# Altium schematic symbol library jlcpcb_2025_04_capacitors_extended_0201.schlib: 1175 symbols (part 3 of 7)
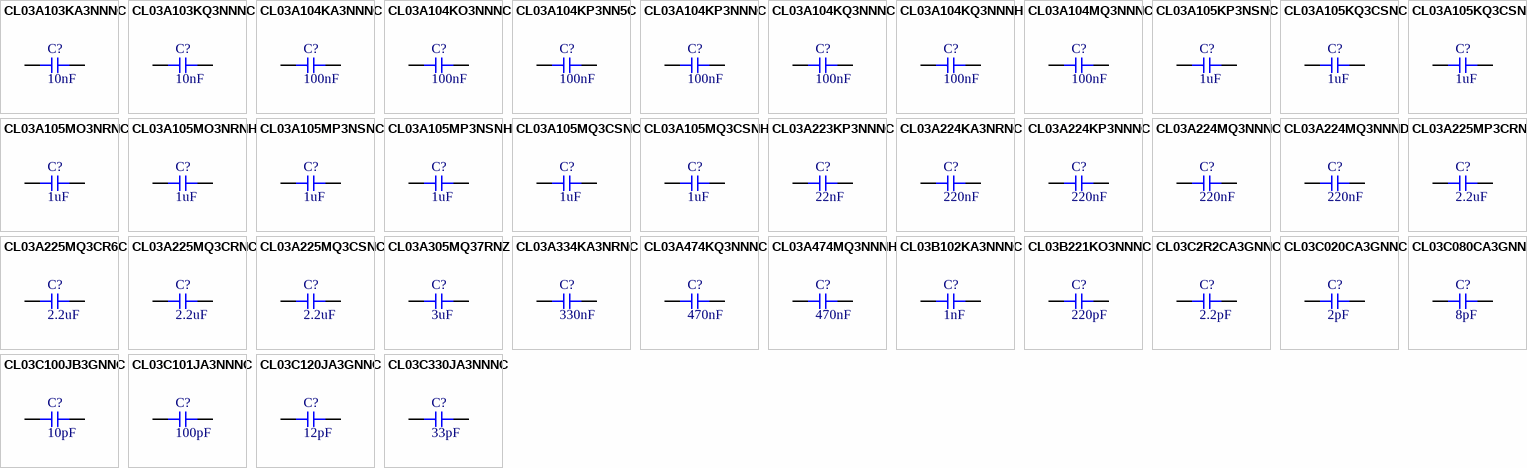
[diagram p31: symbols CL03A103KA3NNNC to CL03C330JA3NNNC]

## CL03A105KQ3CSNH
designator C?  Capacitance: 1uF  (hidden comment: *)
Capacitor, Ceramic (MLCC), 1uF, ±10%, 6.3V, X5R, ±10%, SMD 0201; Manufacturer: Samsung Electro-Mechanics; Manufacturer Part Number: CL03A105KQ3CSNH; Package Size: 0201; JLCPCB Basic Part: No; JLCPCB Part Number: C318542; Supplier 1: LCSC; Category: Capacitors - MLCC; Supplier Part Number 1: C318542; Tolerance: ±10%; Voltage Rating: 6.3V; Temperature Coefficient: X5R; RoHS: Yes; ComponentLink1Description: Datasheet; ComponentLink1URL: https://wmsc.lcsc.com/wmsc/upload/file/pdf/v2/lcsc/2304140030_Samsung-Electro-Mechanics-CL03A105KQ3CSNH_C318542.pdf; ComponentLink2Description: JLCPCB Part URL; ComponentLink2URL: https://jlcpcb.com/partdetail/C318542; ComponentLink3Description: LCSC Part URL; ComponentLink3URL: https://lcsc.com/product-detail/Multilayer-Ceramic-Capacitors-MLCC---SMD-SMT_Samsung-Electro-Mechanics-Samsung-Electro-Mechanics-CL03A105KQ3CSNH_C318542.html; ComponentLink4Description: Samsung Component Library; ComponentLink4URL: https://weblib.samsungsem.com/mlcc/mlcc-ec.do?partNumber=CL03A105KQ3CSN
footprint CAP-0201 (0201 (0603M) Capacitor)
pins: 1, 2

## CL03A105MO3NRNC
designator C?  Capacitance: 1uF  (hidden comment: *)
Capacitor, Ceramic (MLCC), 1uF, ±20%, 16V, X5R, ±20%, SMD 0201; Manufacturer: Samsung Electro-Mechanics; Manufacturer Part Number: CL03A105MO3NRNC; Package Size: 0201; JLCPCB Basic Part: No; JLCPCB Part Number: C318540; Supplier 1: LCSC; Category: Capacitors - MLCC; Supplier Part Number 1: C318540; Tolerance: ±20%; Voltage Rating: 16V; Temperature Coefficient: X5R; RoHS: Yes; ComponentLink1Description: Datasheet; ComponentLink1URL: https://wmsc.lcsc.com/wmsc/upload/file/pdf/v2/lcsc/2401181241_Samsung-Electro-Mechanics-CL03A105MO3NRNC_C318540.pdf; ComponentLink2Description: JLCPCB Part URL; ComponentLink2URL: https://jlcpcb.com/partdetail/C318540; ComponentLink3Description: LCSC Part URL; ComponentLink3URL: https://lcsc.com/product-detail/Multilayer-Ceramic-Capacitors-MLCC---SMD-SMT_Samsung-Electro-Mechanics-Samsung-Electro-Mechanics-CL03A105MO3NRNC_C318540.html; ComponentLink4Description: Samsung Component Library; ComponentLink4URL: https://weblib.samsungsem.com/mlcc/mlcc-ec.do?partNumber=CL03A105MO3NRN
footprint CAP-0201 (0201 (0603M) Capacitor)
pins: 1, 2

## CL03A105MO3NRNH
designator C?  Capacitance: 1uF  (hidden comment: *)
Capacitor, Ceramic (MLCC), 1uF, ±20%, 16V, X5R, ±20%, SMD 0201; Manufacturer: Samsung Electro-Mechanics; Manufacturer Part Number: CL03A105MO3NRNH; Package Size: 0201; JLCPCB Basic Part: No; JLCPCB Part Number: C307385; Supplier 1: LCSC; Category: Capacitors - MLCC; Supplier Part Number 1: C307385; Tolerance: ±20%; Voltage Rating: 16V; Temperature Coefficient: X5R; RoHS: Yes; ComponentLink1Description: Datasheet; ComponentLink1URL: https://wmsc.lcsc.com/wmsc/upload/file/pdf/v2/lcsc/2304140030_Samsung-Electro-Mechanics-CL03A105MO3NRNH_C307385.pdf; ComponentLink2Description: JLCPCB Part URL; ComponentLink2URL: https://jlcpcb.com/partdetail/C307385; ComponentLink3Description: LCSC Part URL; ComponentLink3URL: https://lcsc.com/product-detail/Multilayer-Ceramic-Capacitors-MLCC---SMD-SMT_Samsung-Electro-Mechanics-Samsung-Electro-Mechanics-CL03A105MO3NRNH_C307385.html; ComponentLink4Description: Samsung Component Library; ComponentLink4URL: https://weblib.samsungsem.com/mlcc/mlcc-ec.do?partNumber=CL03A105MO3NRN
footprint CAP-0201 (0201 (0603M) Capacitor)
pins: 1, 2

## CL03A105MP3NSNC
designator C?  Capacitance: 1uF  (hidden comment: *)
Capacitor, Ceramic (MLCC), 1uF, ±20%, 10V, X5R, ±20%, SMD 0201; Manufacturer: Samsung Electro-Mechanics; Manufacturer Part Number: CL03A105MP3NSNC; Package Size: 0201; JLCPCB Basic Part: No; JLCPCB Part Number: C170153; Supplier 1: LCSC; Category: Capacitors - MLCC; Supplier Part Number 1: C170153; Tolerance: ±20%; Voltage Rating: 10V; Temperature Coefficient: X5R; RoHS: Yes; ComponentLink1Description: Datasheet; ComponentLink1URL: https://wmsc.lcsc.com/wmsc/upload/file/pdf/v2/lcsc/2304140030_Samsung-Electro-Mechanics-CL03A105MP3NSNC_C170153.pdf; ComponentLink2Description: JLCPCB Part URL; ComponentLink2URL: https://jlcpcb.com/partdetail/C170153; ComponentLink3Description: LCSC Part URL; ComponentLink3URL: https://lcsc.com/product-detail/Multilayer-Ceramic-Capacitors-MLCC---SMD-SMT_Samsung-Electro-Mechanics-Samsung-Electro-Mechanics-CL03A105MP3NSNC_C170153.html; ComponentLink4Description: Samsung Component Library; ComponentLink4URL: https://weblib.samsungsem.com/mlcc/mlcc-ec.do?partNumber=CL03A105MP3NSN
footprint CAP-0201 (0201 (0603M) Capacitor)
pins: 1, 2

## CL03A105MP3NSNH
designator C?  Capacitance: 1uF  (hidden comment: *)
Capacitor, Ceramic (MLCC), 1uF, 10V, X5R, SMD 0201; Manufacturer: Samsung Electro-Mechanics; Manufacturer Part Number: CL03A105MP3NSNH; Package Size: 0201; JLCPCB Basic Part: No; JLCPCB Part Number: C2991185; Supplier 1: LCSC; Category: Capacitors - MLCC; Supplier Part Number 1: C2991185; Voltage Rating: 10V; Temperature Coefficient: X5R; RoHS: Yes; ComponentLink1Description: Datasheet; ComponentLink1URL: https://wmsc.lcsc.com/wmsc/upload/file/pdf/v2/lcsc/2204121500_Samsung-Electro-Mechanics-CL03A105MP3NSNH_C2991185.pdf; ComponentLink2Description: JLCPCB Part URL; ComponentLink2URL: https://jlcpcb.com/partdetail/C2991185; ComponentLink3Description: LCSC Part URL; ComponentLink3URL: https://lcsc.com/product-detail/Multilayer-Ceramic-Capacitors-MLCC---SMD-SMT_Samsung-Electro-Mechanics-Samsung-Electro-Mechanics-CL03A105MP3NSNH_C2991185.html; ComponentLink4Description: Samsung Component Library; ComponentLink4URL: https://weblib.samsungsem.com/mlcc/mlcc-ec.do?partNumber=CL03A105MP3NSN
footprint CAP-0201 (0201 (0603M) Capacitor)
pins: 1, 2

## CL03A105MQ3CSNC
designator C?  Capacitance: 1uF  (hidden comment: *)
Capacitor, Ceramic (MLCC), 1uF, ±20%, 6.3V, X5R, ±20%, SMD 0201; Manufacturer: Samsung Electro-Mechanics; Manufacturer Part Number: CL03A105MQ3CSNC; Package Size: 0201; JLCPCB Basic Part: No; JLCPCB Part Number: C170152; Supplier 1: LCSC; Category: Capacitors - MLCC; Supplier Part Number 1: C170152; Tolerance: ±20%; Voltage Rating: 6.3V; Temperature Coefficient: X5R; RoHS: Yes; ComponentLink1Description: Datasheet; ComponentLink1URL: https://wmsc.lcsc.com/wmsc/upload/file/pdf/v2/lcsc/2304140030_Samsung-Electro-Mechanics-CL03A105MQ3CSNC_C170152.pdf; ComponentLink2Description: JLCPCB Part URL; ComponentLink2URL: https://jlcpcb.com/partdetail/C170152; ComponentLink3Description: LCSC Part URL; ComponentLink3URL: https://lcsc.com/product-detail/Multilayer-Ceramic-Capacitors-MLCC---SMD-SMT_Samsung-Electro-Mechanics-Samsung-Electro-Mechanics-CL03A105MQ3CSNC_C170152.html; ComponentLink4Description: Samsung Component Library; ComponentLink4URL: https://weblib.samsungsem.com/mlcc/mlcc-ec.do?partNumber=CL03A105MQ3CSN
footprint CAP-0201 (0201 (0603M) Capacitor)
pins: 1, 2

## CL03A105MQ3CSNH
designator C?  Capacitance: 1uF  (hidden comment: *)
Capacitor, Ceramic (MLCC), 1uF, ±20%, 6.3V, X5R, ±20%, SMD 0201; Manufacturer: Samsung Electro-Mechanics; Manufacturer Part Number: CL03A105MQ3CSNH; Package Size: 0201; JLCPCB Basic Part: No; JLCPCB Part Number: C53067; Supplier 1: LCSC; Category: Capacitors - MLCC; Supplier Part Number 1: C53067; Tolerance: ±20%; Voltage Rating: 6.3V; Temperature Coefficient: X5R; RoHS: Yes; ComponentLink1Description: Datasheet; ComponentLink1URL: https://wmsc.lcsc.com/wmsc/upload/file/pdf/v2/lcsc/2304140030_Samsung-Electro-Mechanics-CL03A105MQ3CSNH_C53067.pdf; ComponentLink2Description: JLCPCB Part URL; ComponentLink2URL: https://jlcpcb.com/partdetail/C53067; ComponentLink3Description: LCSC Part URL; ComponentLink3URL: https://lcsc.com/product-detail/Multilayer-Ceramic-Capacitors-MLCC---SMD-SMT_Samsung-Electro-Mechanics-Samsung-Electro-Mechanics-CL03A105MQ3CSNH_C53067.html; ComponentLink4Description: Samsung Component Library; ComponentLink4URL: https://weblib.samsungsem.com/mlcc/mlcc-ec.do?partNumber=CL03A105MQ3CSN
footprint CAP-0201 (0201 (0603M) Capacitor)
pins: 1, 2

## CL03A223KP3NNNC
designator C?  Capacitance: 22nF  (hidden comment: *)
Capacitor, Ceramic (MLCC), 22nF, ±10%, 10V, X5R, ±10%, SMD 0201; Manufacturer: Samsung Electro-Mechanics; Manufacturer Part Number: CL03A223KP3NNNC; Package Size: 0201; JLCPCB Basic Part: No; JLCPCB Part Number: C318550; Supplier 1: LCSC; Category: Capacitors - MLCC; Supplier Part Number 1: C318550; Tolerance: ±10%; Voltage Rating: 10V; Temperature Coefficient: X5R; RoHS: Yes; ComponentLink1Description: Datasheet; ComponentLink1URL: https://wmsc.lcsc.com/wmsc/upload/file/pdf/v2/lcsc/2304140030_Samsung-Electro-Mechanics-CL03A223KP3NNNC_C318550.pdf; ComponentLink2Description: JLCPCB Part URL; ComponentLink2URL: https://jlcpcb.com/partdetail/C318550; ComponentLink3Description: LCSC Part URL; ComponentLink3URL: https://lcsc.com/product-detail/Multilayer-Ceramic-Capacitors-MLCC---SMD-SMT_Samsung-Electro-Mechanics-Samsung-Electro-Mechanics-CL03A223KP3NNNC_C318550.html; ComponentLink4Description: Samsung Component Library; ComponentLink4URL: https://weblib.samsungsem.com/mlcc/mlcc-ec.do?partNumber=CL03A223KP3NNN
footprint CAP-0201 (0201 (0603M) Capacitor)
pins: 1, 2

## CL03A224KA3NRNC
designator C?  Capacitance: 220nF  (hidden comment: *)
Capacitor, Ceramic (MLCC), 220nF, ±10%, 25V, X5R, ±10%, SMD 0201; Manufacturer: Samsung Electro-Mechanics; Manufacturer Part Number: CL03A224KA3NRNC; Package Size: 0201; JLCPCB Basic Part: No; JLCPCB Part Number: C2839438; Supplier 1: LCSC; Category: Capacitors - MLCC; Supplier Part Number 1: C2839438; Tolerance: ±10%; Voltage Rating: 25V; Temperature Coefficient: X5R; RoHS: Yes; ComponentLink1Description: Datasheet; ComponentLink1URL: https://wmsc.lcsc.com/wmsc/upload/file/pdf/v2/lcsc/2202132000_Samsung-Electro-Mechanics-CL03A224KA3NRNC_C2839438.pdf; ComponentLink2Description: JLCPCB Part URL; ComponentLink2URL: https://jlcpcb.com/partdetail/C2839438; ComponentLink3Description: LCSC Part URL; ComponentLink3URL: https://lcsc.com/product-detail/Multilayer-Ceramic-Capacitors-MLCC---SMD-SMT_Samsung-Electro-Mechanics-Samsung-Electro-Mechanics-CL03A224KA3NRNC_C2839438.html; ComponentLink4Description: Samsung Component Library; ComponentLink4URL: https://weblib.samsungsem.com/mlcc/mlcc-ec.do?partNumber=CL03A224KA3NRN
footprint CAP-0201 (0201 (0603M) Capacitor)
pins: 1, 2

## CL03A224KP3NNNC
designator C?  Capacitance: 220nF  (hidden comment: *)
Capacitor, Ceramic (MLCC), 220nF, ±10%, 10V, X5R, ±10%, SMD 0201; Manufacturer: Samsung Electro-Mechanics; Manufacturer Part Number: CL03A224KP3NNNC; Package Size: 0201; JLCPCB Basic Part: No; JLCPCB Part Number: C307386; Supplier 1: LCSC; Category: Capacitors - MLCC; Supplier Part Number 1: C307386; Tolerance: ±10%; Voltage Rating: 10V; Temperature Coefficient: X5R; RoHS: Yes; ComponentLink1Description: Datasheet; ComponentLink1URL: https://wmsc.lcsc.com/wmsc/upload/file/pdf/v2/lcsc/2309061404_Samsung-Electro-Mechanics-CL03A224KP3NNNC_C307386.pdf; ComponentLink2Description: JLCPCB Part URL; ComponentLink2URL: https://jlcpcb.com/partdetail/C307386; ComponentLink3Description: LCSC Part URL; ComponentLink3URL: https://lcsc.com/product-detail/Multilayer-Ceramic-Capacitors-MLCC---SMD-SMT_Samsung-Electro-Mechanics-Samsung-Electro-Mechanics-CL03A224KP3NNNC_C307386.html; ComponentLink4Description: Samsung Component Library; ComponentLink4URL: https://weblib.samsungsem.com/mlcc/mlcc-ec.do?partNumber=CL03A224KP3NNN
footprint CAP-0201 (0201 (0603M) Capacitor)
pins: 1, 2

## CL03A224MQ3NNNC
designator C?  Capacitance: 220nF  (hidden comment: *)
Capacitor, Ceramic (MLCC), 220nF, ±20%, 6.3V, X5R, ±20%, SMD 0201; Manufacturer: Samsung Electro-Mechanics; Manufacturer Part Number: CL03A224MQ3NNNC; Package Size: 0201; JLCPCB Basic Part: No; JLCPCB Part Number: C34696; Supplier 1: LCSC; Category: Capacitors - MLCC; Supplier Part Number 1: C34696; Tolerance: ±20%; Voltage Rating: 6.3V; Temperature Coefficient: X5R; RoHS: Yes; ComponentLink1Description: Datasheet; ComponentLink1URL: https://wmsc.lcsc.com/wmsc/upload/file/pdf/v2/lcsc/2304140030_Samsung-Electro-Mechanics-CL03A224MQ3NNNC_C34696.pdf; ComponentLink2Description: JLCPCB Part URL; ComponentLink2URL: https://jlcpcb.com/partdetail/C34696; ComponentLink3Description: LCSC Part URL; ComponentLink3URL: https://lcsc.com/product-detail/Multilayer-Ceramic-Capacitors-MLCC---SMD-SMT_Samsung-Electro-Mechanics-Samsung-Electro-Mechanics-CL03A224MQ3NNNC_C34696.html; ComponentLink4Description: Samsung Component Library; ComponentLink4URL: https://weblib.samsungsem.com/mlcc/mlcc-ec.do?partNumber=CL03A224MQ3NNN
footprint CAP-0201 (0201 (0603M) Capacitor)
pins: 1, 2

## CL03A224MQ3NNND
designator C?  Capacitance: 220nF  (hidden comment: *)
Capacitor, Ceramic (MLCC), 220nF, ±20%, 6.3V, X5R, ±20%, SMD 0201; Manufacturer: Samsung Electro-Mechanics; Manufacturer Part Number: CL03A224MQ3NNND; Package Size: 0201; JLCPCB Basic Part: No; JLCPCB Part Number: C307387; Supplier 1: LCSC; Category: Capacitors - MLCC; Supplier Part Number 1: C307387; Tolerance: ±20%; Voltage Rating: 6.3V; Temperature Coefficient: X5R; RoHS: Yes; ComponentLink1Description: Datasheet; ComponentLink1URL: https://wmsc.lcsc.com/wmsc/upload/file/pdf/v2/lcsc/2304140030_Samsung-Electro-Mechanics-CL03A224MQ3NNND_C307387.pdf; ComponentLink2Description: JLCPCB Part URL; ComponentLink2URL: https://jlcpcb.com/partdetail/C307387; ComponentLink3Description: LCSC Part URL; ComponentLink3URL: https://lcsc.com/product-detail/Multilayer-Ceramic-Capacitors-MLCC---SMD-SMT_Samsung-Electro-Mechanics-Samsung-Electro-Mechanics-CL03A224MQ3NNND_C307387.html; ComponentLink4Description: Samsung Component Library; ComponentLink4URL: https://weblib.samsungsem.com/mlcc/mlcc-ec.do?partNumber=CL03A224MQ3NNN
footprint CAP-0201 (0201 (0603M) Capacitor)
pins: 1, 2

## CL03A225MP3CRNC
designator C?  Capacitance: 2.2uF  (hidden comment: *)
Capacitor, Ceramic (MLCC), 2.2uF, ±20%, 10V, X5R, ±20%, SMD 0201; Manufacturer: Samsung Electro-Mechanics; Manufacturer Part Number: CL03A225MP3CRNC; Package Size: 0201; JLCPCB Basic Part: No; JLCPCB Part Number: C318539; Supplier 1: LCSC; Category: Capacitors - MLCC; Supplier Part Number 1: C318539; Tolerance: ±20%; Voltage Rating: 10V; Temperature Coefficient: X5R; RoHS: Yes; ComponentLink1Description: Datasheet; ComponentLink1URL: https://wmsc.lcsc.com/wmsc/upload/file/pdf/v2/lcsc/2007201008_Samsung-Electro-Mechanics-CL03A225MP3CRNC_C318539.pdf; ComponentLink2Description: JLCPCB Part URL; ComponentLink2URL: https://jlcpcb.com/partdetail/C318539; ComponentLink3Description: LCSC Part URL; ComponentLink3URL: https://lcsc.com/product-detail/Multilayer-Ceramic-Capacitors-MLCC---SMD-SMT_Samsung-Electro-Mechanics-Samsung-Electro-Mechanics-CL03A225MP3CRNC_C318539.html; ComponentLink4Description: Samsung Component Library; ComponentLink4URL: https://weblib.samsungsem.com/mlcc/mlcc-ec.do?partNumber=CL03A225MP3CRN
footprint CAP-0201 (0201 (0603M) Capacitor)
pins: 1, 2

## CL03A225MQ3CR6C
designator C?  Capacitance: 2.2uF  (hidden comment: *)
Capacitor, Ceramic (MLCC), 2.2uF, ±20%, 6.3V, X5R, ±20%, SMD 0201; Manufacturer: Samsung Electro-Mechanics; Manufacturer Part Number: CL03A225MQ3CR6C; Package Size: 0201; JLCPCB Basic Part: No; JLCPCB Part Number: C307389; Supplier 1: LCSC; Category: Capacitors - MLCC; Supplier Part Number 1: C307389; Tolerance: ±20%; Voltage Rating: 6.3V; Temperature Coefficient: X5R; RoHS: Yes; ComponentLink1Description: Datasheet; ComponentLink1URL: https://wmsc.lcsc.com/wmsc/upload/file/pdf/v2/lcsc/2304140030_Samsung-Electro-Mechanics-CL03A225MQ3CR6C_C307389.pdf; ComponentLink2Description: JLCPCB Part URL; ComponentLink2URL: https://jlcpcb.com/partdetail/C307389; ComponentLink3Description: LCSC Part URL; ComponentLink3URL: https://lcsc.com/product-detail/Multilayer-Ceramic-Capacitors-MLCC---SMD-SMT_Samsung-Electro-Mechanics-Samsung-Electro-Mechanics-CL03A225MQ3CR6C_C307389.html; ComponentLink4Description: Samsung Component Library; ComponentLink4URL: https://weblib.samsungsem.com/mlcc/mlcc-ec.do?partNumber=CL03A225MQ3CR6
footprint CAP-0201 (0201 (0603M) Capacitor)
pins: 1, 2

## CL03A225MQ3CRNC
designator C?  Capacitance: 2.2uF  (hidden comment: *)
Capacitor, Ceramic (MLCC), 2.2uF, ±20%, 6.3V, X5R, ±20%, SMD 0201; Manufacturer: Samsung Electro-Mechanics; Manufacturer Part Number: CL03A225MQ3CRNC; Package Size: 0201; JLCPCB Basic Part: No; JLCPCB Part Number: C77762; Supplier 1: LCSC; Category: Capacitors - MLCC; Supplier Part Number 1: C77762; Tolerance: ±20%; Voltage Rating: 6.3V; Temperature Coefficient: X5R; RoHS: Yes; ComponentLink1Description: Datasheet; ComponentLink1URL: https://wmsc.lcsc.com/wmsc/upload/file/pdf/v2/lcsc/1811071223_Samsung-Electro-Mechanics-CL03A225MQ3CRNC_C77762.pdf; ComponentLink2Description: JLCPCB Part URL; ComponentLink2URL: https://jlcpcb.com/partdetail/C77762; ComponentLink3Description: LCSC Part URL; ComponentLink3URL: https://lcsc.com/product-detail/Multilayer-Ceramic-Capacitors-MLCC---SMD-SMT_Samsung-Electro-Mechanics-Samsung-Electro-Mechanics-CL03A225MQ3CRNC_C77762.html; ComponentLink4Description: Samsung Component Library; ComponentLink4URL: https://weblib.samsungsem.com/mlcc/mlcc-ec.do?partNumber=CL03A225MQ3CRN
footprint CAP-0201 (0201 (0603M) Capacitor)
pins: 1, 2

## CL03A225MQ3CSNC
designator C?  Capacitance: 2.2uF  (hidden comment: *)
Capacitor, Ceramic (MLCC), 2.2uF, ±20%, 6.3V, X5R, ±20%, SMD 0201; Manufacturer: Samsung Electro-Mechanics; Manufacturer Part Number: CL03A225MQ3CSNC; Package Size: 0201; JLCPCB Basic Part: No; JLCPCB Part Number: C2839439; Supplier 1: LCSC; Category: Capacitors - MLCC; Supplier Part Number 1: C2839439; Tolerance: ±20%; Voltage Rating: 6.3V; Temperature Coefficient: X5R; RoHS: Yes; ComponentLink1Description: Datasheet; ComponentLink1URL: https://wmsc.lcsc.com/wmsc/upload/file/pdf/v2/lcsc/2304140030_Samsung-Electro-Mechanics-CL03A225MQ3CSNC_C2839439.pdf; ComponentLink2Description: JLCPCB Part URL; ComponentLink2URL: https://jlcpcb.com/partdetail/C2839439; ComponentLink3Description: LCSC Part URL; ComponentLink3URL: https://lcsc.com/product-detail/Multilayer-Ceramic-Capacitors-MLCC---SMD-SMT_Samsung-Electro-Mechanics-Samsung-Electro-Mechanics-CL03A225MQ3CSNC_C2839439.html; ComponentLink4Description: Samsung Component Library; ComponentLink4URL: https://weblib.samsungsem.com/mlcc/mlcc-ec.do?partNumber=CL03A225MQ3CSN
footprint CAP-0201 (0201 (0603M) Capacitor)
pins: 1, 2

## CL03A305MQ37RNZ
designator C?  Capacitance: 3uF  (hidden comment: *)
Capacitor, Ceramic (MLCC), 3uF, ±20%, 6.3V, X5R, ±20%, SMD 0201; Manufacturer: Samsung Electro-Mechanics; Manufacturer Part Number: CL03A305MQ37RNZ; Package Size: 0201; JLCPCB Basic Part: No; JLCPCB Part Number: C514591; Supplier 1: LCSC; Category: Capacitors - MLCC; Supplier Part Number 1: C514591; Tolerance: ±20%; Voltage Rating: 6.3V; Temperature Coefficient: X5R; RoHS: Yes; ComponentLink1Description: Datasheet; ComponentLink1URL: https://wmsc.lcsc.com/wmsc/upload/file/pdf/v2/lcsc/2304140030_Samsung-Electro-Mechanics-CL03A305MQ37RNZ_C514591.pdf; ComponentLink2Description: JLCPCB Part URL; ComponentLink2URL: https://jlcpcb.com/partdetail/C514591; ComponentLink3Description: LCSC Part URL; ComponentLink3URL: https://lcsc.com/product-detail/Multilayer-Ceramic-Capacitors-MLCC---SMD-SMT_Samsung-Electro-Mechanics-Samsung-Electro-Mechanics-CL03A305MQ37RNZ_C514591.html; ComponentLink4Description: Samsung Component Library; ComponentLink4URL: https://weblib.samsungsem.com/mlcc/mlcc-ec.do?partNumber=CL03A305MQ37RN
footprint CAP-0201 (0201 (0603M) Capacitor)
pins: 1, 2

## CL03A334KA3NRNC
designator C?  Capacitance: 330nF  (hidden comment: *)
Capacitor, Ceramic (MLCC), 330nF, ±10%, 25V, X5R, ±10%, SMD 0201; Manufacturer: Samsung Electro-Mechanics; Manufacturer Part Number: CL03A334KA3NRNC; Package Size: 0201; JLCPCB Basic Part: No; JLCPCB Part Number: C2980695; Supplier 1: LCSC; Category: Capacitors - MLCC; Supplier Part Number 1: C2980695; Tolerance: ±10%; Voltage Rating: 25V; Temperature Coefficient: X5R; RoHS: Yes; ComponentLink1Description: Datasheet; ComponentLink1URL: https://wmsc.lcsc.com/wmsc/upload/file/pdf/v2/lcsc/2203081130_Samsung-Electro-Mechanics-CL03A334KA3NRNC_C2980695.pdf; ComponentLink2Description: JLCPCB Part URL; ComponentLink2URL: https://jlcpcb.com/partdetail/C2980695; ComponentLink3Description: LCSC Part URL; ComponentLink3URL: https://lcsc.com/product-detail/Multilayer-Ceramic-Capacitors-MLCC---SMD-SMT_Samsung-Electro-Mechanics-Samsung-Electro-Mechanics-CL03A334KA3NRNC_C2980695.html; ComponentLink4Description: Samsung Component Library; ComponentLink4URL: https://weblib.samsungsem.com/mlcc/mlcc-ec.do?partNumber=CL03A334KA3NRN
footprint CAP-0201 (0201 (0603M) Capacitor)
pins: 1, 2

## CL03A474KQ3NNNC
designator C?  Capacitance: 470nF  (hidden comment: *)
Capacitor, Ceramic (MLCC), 470nF, ±10%, 6.3V, X5R, ±10%, SMD 0201; Manufacturer: Samsung Electro-Mechanics; Manufacturer Part Number: CL03A474KQ3NNNC; Package Size: 0201; JLCPCB Basic Part: No; JLCPCB Part Number: C318543; Supplier 1: LCSC; Category: Capacitors - MLCC; Supplier Part Number 1: C318543; Tolerance: ±10%; Voltage Rating: 6.3V; Temperature Coefficient: X5R; RoHS: Yes; ComponentLink1Description: Datasheet; ComponentLink1URL: https://wmsc.lcsc.com/wmsc/upload/file/pdf/v2/lcsc/2304140030_Samsung-Electro-Mechanics-CL03A474KQ3NNNC_C318543.pdf; ComponentLink2Description: JLCPCB Part URL; ComponentLink2URL: https://jlcpcb.com/partdetail/C318543; ComponentLink3Description: LCSC Part URL; ComponentLink3URL: https://lcsc.com/product-detail/Multilayer-Ceramic-Capacitors-MLCC---SMD-SMT_Samsung-Electro-Mechanics-Samsung-Electro-Mechanics-CL03A474KQ3NNNC_C318543.html; ComponentLink4Description: Samsung Component Library; ComponentLink4URL: https://weblib.samsungsem.com/mlcc/mlcc-ec.do?partNumber=CL03A474KQ3NNN
footprint CAP-0201 (0201 (0603M) Capacitor)
pins: 1, 2

## CL03A474MQ3NNNH
designator C?  Capacitance: 470nF  (hidden comment: *)
Capacitor, Ceramic (MLCC), 470nF, ±20%, 6.3V, X5R, ±20%, SMD 0201; Manufacturer: Samsung Electro-Mechanics; Manufacturer Part Number: CL03A474MQ3NNNH; Package Size: 0201; JLCPCB Basic Part: No; JLCPCB Part Number: C2992535; Supplier 1: LCSC; Category: Capacitors - MLCC; Supplier Part Number 1: C2992535; Tolerance: ±20%; Voltage Rating: 6.3V; Temperature Coefficient: X5R; RoHS: Yes; ComponentLink1Description: Datasheet; ComponentLink1URL: https://wmsc.lcsc.com/wmsc/upload/file/pdf/v2/lcsc/2204191800_Samsung-Electro-Mechanics-CL03A474MQ3NNNH_C2992535.pdf; ComponentLink2Description: JLCPCB Part URL; ComponentLink2URL: https://jlcpcb.com/partdetail/C2992535; ComponentLink3Description: LCSC Part URL; ComponentLink3URL: https://lcsc.com/product-detail/Multilayer-Ceramic-Capacitors-MLCC---SMD-SMT_Samsung-Electro-Mechanics-Samsung-Electro-Mechanics-CL03A474MQ3NNNH_C2992535.html; ComponentLink4Description: Samsung Component Library; ComponentLink4URL: https://weblib.samsungsem.com/mlcc/mlcc-ec.do?partNumber=CL03A474MQ3NNN
footprint CAP-0201 (0201 (0603M) Capacitor)
pins: 1, 2

## CL03B102KA3NNNC
designator C?  Capacitance: 1nF  (hidden comment: *)
Capacitor, Ceramic (MLCC), 1nF, ±10%, 25V, X7R, ±10%, SMD 0201; Manufacturer: Samsung Electro-Mechanics; Manufacturer Part Number: CL03B102KA3NNNC; Package Size: 0201; JLCPCB Basic Part: No; JLCPCB Part Number: C307390; Supplier 1: LCSC; Category: Capacitors - MLCC; Supplier Part Number 1: C307390; Tolerance: ±10%; Voltage Rating: 25V; Temperature Coefficient: X7R; RoHS: Yes; ComponentLink1Description: Datasheet; ComponentLink1URL: https://wmsc.lcsc.com/wmsc/upload/file/pdf/v2/lcsc/2304140030_Samsung-Electro-Mechanics-CL03B102KA3NNNC_C307390.pdf; ComponentLink2Description: JLCPCB Part URL; ComponentLink2URL: https://jlcpcb.com/partdetail/C307390; ComponentLink3Description: LCSC Part URL; ComponentLink3URL: https://lcsc.com/product-detail/Multilayer-Ceramic-Capacitors-MLCC---SMD-SMT_Samsung-Electro-Mechanics-Samsung-Electro-Mechanics-CL03B102KA3NNNC_C307390.html; ComponentLink4Description: Samsung Component Library; ComponentLink4URL: https://weblib.samsungsem.com/mlcc/mlcc-ec.do?partNumber=CL03B102KA3NNN
footprint CAP-0201 (0201 (0603M) Capacitor)
pins: 1, 2

## CL03B221KO3NNNC
designator C?  Capacitance: 220pF  (hidden comment: *)
Capacitor, Ceramic (MLCC), 220pF, ±10%, 16V, X7R, ±10%, SMD 0201; Manufacturer: Samsung Electro-Mechanics; Manufacturer Part Number: CL03B221KO3NNNC; Package Size: 0201; JLCPCB Basic Part: No; JLCPCB Part Number: C318553; Supplier 1: LCSC; Category: Capacitors - MLCC; Supplier Part Number 1: C318553; Tolerance: ±10%; Voltage Rating: 16V; Temperature Coefficient: X7R; RoHS: Yes; ComponentLink1Description: Datasheet; ComponentLink1URL: https://wmsc.lcsc.com/wmsc/upload/file/pdf/v2/lcsc/2304140030_Samsung-Electro-Mechanics-CL03B221KO3NNNC_C318553.pdf; ComponentLink2Description: JLCPCB Part URL; ComponentLink2URL: https://jlcpcb.com/partdetail/C318553; ComponentLink3Description: LCSC Part URL; ComponentLink3URL: https://lcsc.com/product-detail/Multilayer-Ceramic-Capacitors-MLCC---SMD-SMT_Samsung-Electro-Mechanics-Samsung-Electro-Mechanics-CL03B221KO3NNNC_C318553.html; ComponentLink4Description: Samsung Component Library; ComponentLink4URL: https://weblib.samsungsem.com/mlcc/mlcc-ec.do?partNumber=CL03B221KO3NNN
footprint CAP-0201 (0201 (0603M) Capacitor)
pins: 1, 2

## CL03C2R2CA3GNNC
designator C?  Capacitance: 2.2pF  (hidden comment: *)
Capacitor, Ceramic (MLCC), 2.2pF, 25V, C0G, SMD 0201; Manufacturer: Samsung Electro-Mechanics; Manufacturer Part Number: CL03C2R2CA3GNNC; Package Size: 0201; JLCPCB Basic Part: No; JLCPCB Part Number: C514586; Supplier 1: LCSC; Category: Capacitors - MLCC; Supplier Part Number 1: C514586; Voltage Rating: 25V; Temperature Coefficient: C0G; RoHS: Yes; ComponentLink1Description: Datasheet; ComponentLink1URL: https://wmsc.lcsc.com/wmsc/upload/file/pdf/v2/lcsc/2304140030_Samsung-Electro-Mechanics-CL03C2R2CA3GNNC_C514586.pdf; ComponentLink2Description: JLCPCB Part URL; ComponentLink2URL: https://jlcpcb.com/partdetail/C514586; ComponentLink3Description: LCSC Part URL; ComponentLink3URL: https://lcsc.com/product-detail/Multilayer-Ceramic-Capacitors-MLCC---SMD-SMT_Samsung-Electro-Mechanics-Samsung-Electro-Mechanics-CL03C2R2CA3GNNC_C514586.html; ComponentLink4Description: Samsung Component Library; ComponentLink4URL: https://weblib.samsungsem.com/mlcc/mlcc-ec.do?partNumber=CL03C2R2CA3GNN
footprint CAP-0201 (0201 (0603M) Capacitor)
pins: 1, 2

## CL03C020CA3GNNC
designator C?  Capacitance: 2pF  (hidden comment: *)
Capacitor, Ceramic (MLCC), 2pF, 25V, C0G, SMD 0201; Manufacturer: Samsung Electro-Mechanics; Manufacturer Part Number: CL03C020CA3GNNC; Package Size: 0201; JLCPCB Basic Part: No; JLCPCB Part Number: C307395; Supplier 1: LCSC; Category: Capacitors - MLCC; Supplier Part Number 1: C307395; Voltage Rating: 25V; Temperature Coefficient: C0G; RoHS: Yes; ComponentLink1Description: Datasheet; ComponentLink1URL: https://wmsc.lcsc.com/wmsc/upload/file/pdf/v2/lcsc/2304140030_Samsung-Electro-Mechanics-CL03C020CA3GNNC_C307395.pdf; ComponentLink2Description: JLCPCB Part URL; ComponentLink2URL: https://jlcpcb.com/partdetail/C307395; ComponentLink3Description: LCSC Part URL; ComponentLink3URL: https://lcsc.com/product-detail/Multilayer-Ceramic-Capacitors-MLCC---SMD-SMT_Samsung-Electro-Mechanics-Samsung-Electro-Mechanics-CL03C020CA3GNNC_C307395.html; ComponentLink4Description: Samsung Component Library; ComponentLink4URL: https://weblib.samsungsem.com/mlcc/mlcc-ec.do?partNumber=CL03C020CA3GNN
footprint CAP-0201 (0201 (0603M) Capacitor)
pins: 1, 2

## CL03C080CA3GNNC
designator C?  Capacitance: 8pF  (hidden comment: *)
Capacitor, Ceramic (MLCC), 8pF, 25V, C0G, SMD 0201; Manufacturer: Samsung Electro-Mechanics; Manufacturer Part Number: CL03C080CA3GNNC; Package Size: 0201; JLCPCB Basic Part: No; JLCPCB Part Number: C730419; Supplier 1: LCSC; Category: Capacitors - MLCC; Supplier Part Number 1: C730419; Voltage Rating: 25V; Temperature Coefficient: C0G; RoHS: Yes; ComponentLink1Description: Datasheet; ComponentLink1URL: https://wmsc.lcsc.com/wmsc/upload/file/pdf/v2/lcsc/2304140030_Samsung-Electro-Mechanics-CL03C080CA3GNNC_C730419.pdf; ComponentLink2Description: JLCPCB Part URL; ComponentLink2URL: https://jlcpcb.com/partdetail/C730419; ComponentLink3Description: LCSC Part URL; ComponentLink3URL: https://lcsc.com/product-detail/Multilayer-Ceramic-Capacitors-MLCC---SMD-SMT_Samsung-Electro-Mechanics-Samsung-Electro-Mechanics-CL03C080CA3GNNC_C730419.html; ComponentLink4Description: Samsung Component Library; ComponentLink4URL: https://weblib.samsungsem.com/mlcc/mlcc-ec.do?partNumber=CL03C080CA3GNN
footprint CAP-0201 (0201 (0603M) Capacitor)
pins: 1, 2

## CL03C100JB3GNNC
designator C?  Capacitance: 10pF  (hidden comment: *)
Capacitor, Ceramic (MLCC), 10pF, ±5%, 50V, C0G, ±5%, SMD 0201; Manufacturer: Samsung Electro-Mechanics; Manufacturer Part Number: CL03C100JB3GNNC; Package Size: 0201; JLCPCB Basic Part: No; JLCPCB Part Number: C2991796; Supplier 1: LCSC; Category: Capacitors - MLCC; Supplier Part Number 1: C2991796; Tolerance: ±5%; Voltage Rating: 50V; Temperature Coefficient: C0G; RoHS: Yes; ComponentLink1Description: Datasheet; ComponentLink1URL: https://wmsc.lcsc.com/wmsc/upload/file/pdf/v2/lcsc/2204111200_Samsung-Electro-Mechanics-CL03C100JB3GNNC_C2991796.pdf; ComponentLink2Description: JLCPCB Part URL; ComponentLink2URL: https://jlcpcb.com/partdetail/C2991796; ComponentLink3Description: LCSC Part URL; ComponentLink3URL: https://lcsc.com/product-detail/Multilayer-Ceramic-Capacitors-MLCC---SMD-SMT_Samsung-Electro-Mechanics-Samsung-Electro-Mechanics-CL03C100JB3GNNC_C2991796.html; ComponentLink4Description: Samsung Component Library; ComponentLink4URL: https://weblib.samsungsem.com/mlcc/mlcc-ec.do?partNumber=CL03C100JB3GNN
footprint CAP-0201 (0201 (0603M) Capacitor)
pins: 1, 2

## CL03C101JA3NNNC
designator C?  Capacitance: 100pF  (hidden comment: *)
Capacitor, Ceramic (MLCC), 100pF, ±5%, 25V, C0G, ±5%, SMD 0201; Manufacturer: Samsung Electro-Mechanics; Manufacturer Part Number: CL03C101JA3NNNC; Package Size: 0201; JLCPCB Basic Part: No; JLCPCB Part Number: C377739; Supplier 1: LCSC; Category: Capacitors - MLCC; Supplier Part Number 1: C377739; Tolerance: ±5%; Voltage Rating: 25V; Temperature Coefficient: C0G; RoHS: Yes; ComponentLink1Description: Datasheet; ComponentLink1URL: https://wmsc.lcsc.com/wmsc/upload/file/pdf/v2/lcsc/2304140030_Samsung-Electro-Mechanics-CL03C101JA3NNNC_C377739.pdf; ComponentLink2Description: JLCPCB Part URL; ComponentLink2URL: https://jlcpcb.com/partdetail/C377739; ComponentLink3Description: LCSC Part URL; ComponentLink3URL: https://lcsc.com/product-detail/Multilayer-Ceramic-Capacitors-MLCC---SMD-SMT_Samsung-Electro-Mechanics-Samsung-Electro-Mechanics-CL03C101JA3NNNC_C377739.html; ComponentLink4Description: Samsung Component Library; ComponentLink4URL: https://weblib.samsungsem.com/mlcc/mlcc-ec.do?partNumber=CL03C101JA3NNN
footprint CAP-0201 (0201 (0603M) Capacitor)
pins: 1, 2

## CL03C120JA3GNNC
designator C?  Capacitance: 12pF  (hidden comment: *)
Capacitor, Ceramic (MLCC), 12pF, ±5%, 25V, C0G, ±5%, SMD 0201; Manufacturer: Samsung Electro-Mechanics; Manufacturer Part Number: CL03C120JA3GNNC; Package Size: 0201; JLCPCB Basic Part: No; JLCPCB Part Number: C318554; Supplier 1: LCSC; Category: Capacitors - MLCC; Supplier Part Number 1: C318554; Tolerance: ±5%; Voltage Rating: 25V; Temperature Coefficient: C0G; RoHS: Yes; ComponentLink1Description: Datasheet; ComponentLink1URL: https://wmsc.lcsc.com/wmsc/upload/file/pdf/v2/lcsc/2304140030_Samsung-Electro-Mechanics-CL03C120JA3GNNC_C318554.pdf; ComponentLink2Description: JLCPCB Part URL; ComponentLink2URL: https://jlcpcb.com/partdetail/C318554; ComponentLink3Description: LCSC Part URL; ComponentLink3URL: https://lcsc.com/product-detail/Multilayer-Ceramic-Capacitors-MLCC---SMD-SMT_Samsung-Electro-Mechanics-Samsung-Electro-Mechanics-CL03C120JA3GNNC_C318554.html; ComponentLink4Description: Samsung Component Library; ComponentLink4URL: https://weblib.samsungsem.com/mlcc/mlcc-ec.do?partNumber=CL03C120JA3GNN
footprint CAP-0201 (0201 (0603M) Capacitor)
pins: 1, 2

## CL03C330JA3NNNC
designator C?  Capacitance: 33pF  (hidden comment: *)
Capacitor, Ceramic (MLCC), 33pF, ±5%, 25V, C0G, ±5%, SMD 0201; Manufacturer: Samsung Electro-Mechanics; Manufacturer Part Number: CL03C330JA3NNNC; Package Size: 0201; JLCPCB Basic Part: No; JLCPCB Part Number: C377744; Supplier 1: LCSC; Category: Capacitors - MLCC; Supplier Part Number 1: C377744; Tolerance: ±5%; Voltage Rating: 25V; Temperature Coefficient: C0G; RoHS: Yes; ComponentLink1Description: Datasheet; ComponentLink1URL: https://wmsc.lcsc.com/wmsc/upload/file/pdf/v2/lcsc/2304140030_Samsung-Electro-Mechanics-CL03C330JA3NNNC_C377744.pdf; ComponentLink2Description: JLCPCB Part URL; ComponentLink2URL: https://jlcpcb.com/partdetail/C377744; ComponentLink3Description: LCSC Part URL; ComponentLink3URL: https://lcsc.com/product-detail/Multilayer-Ceramic-Capacitors-MLCC---SMD-SMT_Samsung-Electro-Mechanics-Samsung-Electro-Mechanics-CL03C330JA3NNNC_C377744.html; ComponentLink4Description: Samsung Component Library; ComponentLink4URL: https://weblib.samsungsem.com/mlcc/mlcc-ec.do?partNumber=CL03C330JA3NNN
footprint CAP-0201 (0201 (0603M) Capacitor)
pins: 1, 2

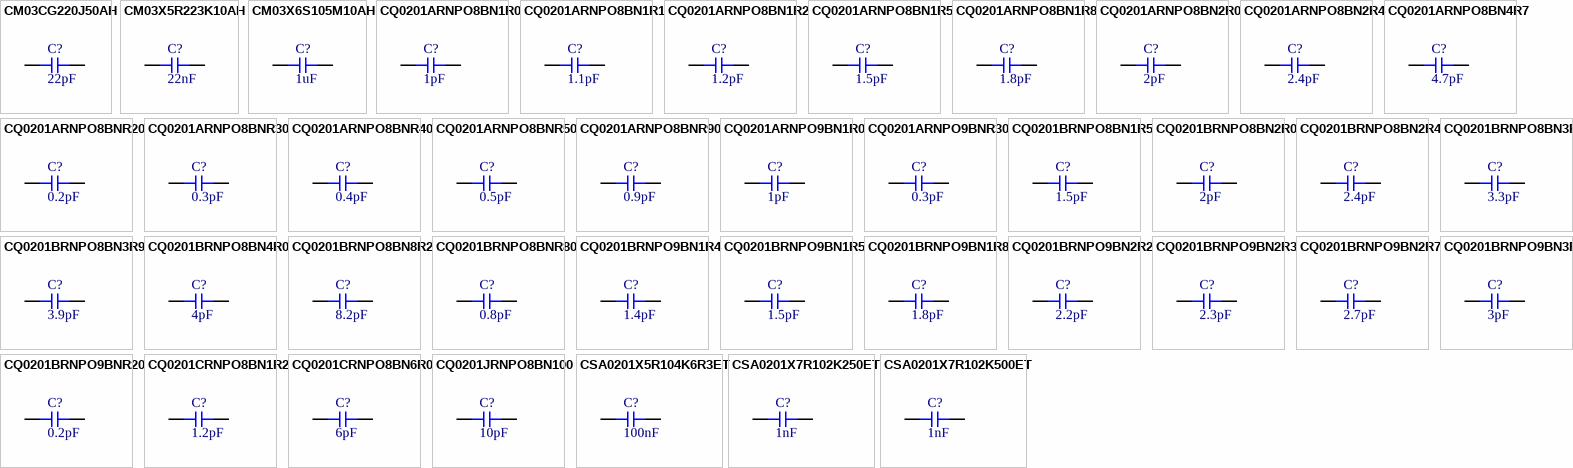
[diagram p10: symbols CM03CG220J50AH to CSA0201X7R102K500ET]

## CM03CG220J50AH
designator C?  Capacitance: 22pF  (hidden comment: *)
Capacitor, Ceramic (MLCC), 22pF, 50V, SMD 0201; Manufacturer: Kyocera AVX; Manufacturer Part Number: CM03CG220J50AH; Package Size: 0201; JLCPCB Basic Part: No; JLCPCB Part Number: C2858006; Supplier 1: LCSC; Category: Capacitors - MLCC; Supplier Part Number 1: C2858006; Voltage Rating: 50V; RoHS: Yes; ComponentLink1Description: Datasheet; ComponentLink2Description: JLCPCB Part URL; ComponentLink2URL: https://jlcpcb.com/partdetail/C2858006; ComponentLink3Description: LCSC Part URL; ComponentLink3URL: https://lcsc.com/product-detail/Multilayer-Ceramic-Capacitors-MLCC---SMD-SMT_Kyocera-AVX-Kyocera-AVX-CM03CG220J50AH_C2858006.html
footprint CAP-0201 (0201 (0603M) Capacitor)
pins: 1, 2

## CM03X5R223K10AH
designator C?  Capacitance: 22nF  (hidden comment: *)
Capacitor, Ceramic (MLCC), 22nF, ±10%, 10V, X5R, ±10%, SMD 0201; Manufacturer: Kyocera AVX; Manufacturer Part Number: CM03X5R223K10AH; Package Size: 0201; JLCPCB Basic Part: No; JLCPCB Part Number: C274415; Supplier 1: LCSC; Category: Capacitors - MLCC; Supplier Part Number 1: C274415; Tolerance: ±10%; Voltage Rating: 10V; Temperature Coefficient: X5R; RoHS: Yes; ComponentLink1Description: Datasheet; ComponentLink1URL: https://wmsc.lcsc.com/wmsc/upload/file/pdf/v2/lcsc/2007031717_Kyocera-AVX-CM03X5R223K10AH_C274415.pdf; ComponentLink2Description: JLCPCB Part URL; ComponentLink2URL: https://jlcpcb.com/partdetail/C274415; ComponentLink3Description: LCSC Part URL; ComponentLink3URL: https://lcsc.com/product-detail/Multilayer-Ceramic-Capacitors-MLCC---SMD-SMT_Kyocera-AVX-Kyocera-AVX-CM03X5R223K10AH_C274415.html
footprint CAP-0201 (0201 (0603M) Capacitor)
pins: 1, 2

## CM03X6S105M10AH
designator C?  Capacitance: 1uF  (hidden comment: *)
Capacitor, Ceramic (MLCC), 1uF, ±20%, 10V, X6S, ±20%, SMD 0201; Manufacturer: Kyocera AVX; Manufacturer Part Number: CM03X6S105M10AH; Package Size: 0201; JLCPCB Basic Part: No; JLCPCB Part Number: C5156948; Supplier 1: LCSC; Category: Capacitors - MLCC; Supplier Part Number 1: C5156948; Tolerance: ±20%; Voltage Rating: 10V; Temperature Coefficient: X6S; RoHS: Yes; ComponentLink1Description: Datasheet; ComponentLink1URL: https://wmsc.lcsc.com/wmsc/upload/file/pdf/v2/lcsc/2209131730_Kyocera-AVX-CM03X6S105M10AH_C5156948.pdf; ComponentLink2Description: JLCPCB Part URL; ComponentLink2URL: https://jlcpcb.com/partdetail/C5156948; ComponentLink3Description: LCSC Part URL; ComponentLink3URL: https://lcsc.com/product-detail/Multilayer-Ceramic-Capacitors-MLCC---SMD-SMT_Kyocera-AVX-Kyocera-AVX-CM03X6S105M10AH_C5156948.html
footprint CAP-0201 (0201 (0603M) Capacitor)
pins: 1, 2

## CQ0201ARNPO8BN1R0
designator C?  Capacitance: 1pF  (hidden comment: *)
Capacitor, Ceramic (MLCC), 1pF, 25V, NP0, SMD 0201; Manufacturer: YAGEO; Manufacturer Part Number: CQ0201ARNPO8BN1R0; Package Size: 0201; JLCPCB Basic Part: No; JLCPCB Part Number: C2205254; Supplier 1: LCSC; Category: Capacitors - MLCC; Supplier Part Number 1: C2205254; Voltage Rating: 25V; Temperature Coefficient: NP0; RoHS: Yes; ComponentLink1Description: Datasheet; ComponentLink1URL: https://wmsc.lcsc.com/wmsc/upload/file/pdf/v2/lcsc/2304140030_YAGEO-CQ0201ARNPO8BN1R0_C2205254.pdf; ComponentLink2Description: JLCPCB Part URL; ComponentLink2URL: https://jlcpcb.com/partdetail/C2205254; ComponentLink3Description: LCSC Part URL; ComponentLink3URL: https://lcsc.com/product-detail/Multilayer-Ceramic-Capacitors-MLCC---SMD-SMT_YAGEO-YAGEO-CQ0201ARNPO8BN1R0_C2205254.html
footprint CAP-0201 (0201 (0603M) Capacitor)
pins: 1, 2

## CQ0201ARNPO8BN1R1
designator C?  Capacitance: 1.1pF  (hidden comment: *)
Capacitor, Ceramic (MLCC), 1.1pF, 25V, NP0, SMD 0201; Manufacturer: YAGEO; Manufacturer Part Number: CQ0201ARNPO8BN1R1; Package Size: 0201; JLCPCB Basic Part: No; JLCPCB Part Number: C2930552; Supplier 1: LCSC; Category: Capacitors - MLCC; Supplier Part Number 1: C2930552; Voltage Rating: 25V; Temperature Coefficient: NP0; RoHS: Yes; ComponentLink1Description: Datasheet; ComponentLink1URL: https://wmsc.lcsc.com/wmsc/upload/file/pdf/v2/lcsc/2201121500_YAGEO-CQ0201ARNPO8BN1R1_C2930552.pdf; ComponentLink2Description: JLCPCB Part URL; ComponentLink2URL: https://jlcpcb.com/partdetail/C2930552; ComponentLink3Description: LCSC Part URL; ComponentLink3URL: https://lcsc.com/product-detail/Multilayer-Ceramic-Capacitors-MLCC---SMD-SMT_YAGEO-YAGEO-CQ0201ARNPO8BN1R1_C2930552.html
footprint CAP-0201 (0201 (0603M) Capacitor)
pins: 1, 2

## CQ0201ARNPO8BN1R2
designator C?  Capacitance: 1.2pF  (hidden comment: *)
Capacitor, Ceramic (MLCC), 1.2pF, 25V, NP0, SMD 0201; Manufacturer: YAGEO; Manufacturer Part Number: CQ0201ARNPO8BN1R2; Package Size: 0201; JLCPCB Basic Part: No; JLCPCB Part Number: C2214607; Supplier 1: LCSC; Category: Capacitors - MLCC; Supplier Part Number 1: C2214607; Voltage Rating: 25V; Temperature Coefficient: NP0; RoHS: Yes; ComponentLink1Description: Datasheet; ComponentLink1URL: https://wmsc.lcsc.com/wmsc/upload/file/pdf/v2/lcsc/2304140030_YAGEO-CQ0201ARNPO8BN1R2_C2214607.pdf; ComponentLink2Description: JLCPCB Part URL; ComponentLink2URL: https://jlcpcb.com/partdetail/C2214607; ComponentLink3Description: LCSC Part URL; ComponentLink3URL: https://lcsc.com/product-detail/Multilayer-Ceramic-Capacitors-MLCC---SMD-SMT_YAGEO-YAGEO-CQ0201ARNPO8BN1R2_C2214607.html
footprint CAP-0201 (0201 (0603M) Capacitor)
pins: 1, 2

## CQ0201ARNPO8BN1R5
designator C?  Capacitance: 1.5pF  (hidden comment: *)
Capacitor, Ceramic (MLCC), 1.5pF, 25V, NP0, SMD 0201; Manufacturer: YAGEO; Manufacturer Part Number: CQ0201ARNPO8BN1R5; Package Size: 0201; JLCPCB Basic Part: No; JLCPCB Part Number: C2214853; Supplier 1: LCSC; Category: Capacitors - MLCC; Supplier Part Number 1: C2214853; Voltage Rating: 25V; Temperature Coefficient: NP0; RoHS: Yes; ComponentLink1Description: Datasheet; ComponentLink1URL: https://wmsc.lcsc.com/wmsc/upload/file/pdf/v2/lcsc/2304140030_YAGEO-CQ0201ARNPO8BN1R5_C2214853.pdf; ComponentLink2Description: JLCPCB Part URL; ComponentLink2URL: https://jlcpcb.com/partdetail/C2214853; ComponentLink3Description: LCSC Part URL; ComponentLink3URL: https://lcsc.com/product-detail/Multilayer-Ceramic-Capacitors-MLCC---SMD-SMT_YAGEO-YAGEO-CQ0201ARNPO8BN1R5_C2214853.html
footprint CAP-0201 (0201 (0603M) Capacitor)
pins: 1, 2

## CQ0201ARNPO8BN1R8
designator C?  Capacitance: 1.8pF  (hidden comment: *)
Capacitor, Ceramic (MLCC), 1.8pF, 25V, NP0, SMD 0201; Manufacturer: YAGEO; Manufacturer Part Number: CQ0201ARNPO8BN1R8; Package Size: 0201; JLCPCB Basic Part: No; JLCPCB Part Number: C2983564; Supplier 1: LCSC; Category: Capacitors - MLCC; Supplier Part Number 1: C2983564; Voltage Rating: 25V; Temperature Coefficient: NP0; RoHS: Yes; ComponentLink1Description: Datasheet; ComponentLink1URL: https://wmsc.lcsc.com/wmsc/upload/file/pdf/v2/lcsc/2203221030_YAGEO-CQ0201ARNPO8BN1R8_C2983564.pdf; ComponentLink2Description: JLCPCB Part URL; ComponentLink2URL: https://jlcpcb.com/partdetail/C2983564; ComponentLink3Description: LCSC Part URL; ComponentLink3URL: https://lcsc.com/product-detail/Multilayer-Ceramic-Capacitors-MLCC---SMD-SMT_YAGEO-YAGEO-CQ0201ARNPO8BN1R8_C2983564.html
footprint CAP-0201 (0201 (0603M) Capacitor)
pins: 1, 2

## CQ0201ARNPO8BN2R0
designator C?  Capacitance: 2pF  (hidden comment: *)
Capacitor, Ceramic (MLCC), 2pF, 25V, NP0, SMD 0201; Manufacturer: YAGEO; Manufacturer Part Number: CQ0201ARNPO8BN2R0; Package Size: 0201; JLCPCB Basic Part: No; JLCPCB Part Number: C2204559; Supplier 1: LCSC; Category: Capacitors - MLCC; Supplier Part Number 1: C2204559; Voltage Rating: 25V; Temperature Coefficient: NP0; RoHS: Yes; ComponentLink1Description: Datasheet; ComponentLink1URL: https://wmsc.lcsc.com/wmsc/upload/file/pdf/v2/lcsc/2304140030_YAGEO-CQ0201ARNPO8BN2R0_C2204559.pdf; ComponentLink2Description: JLCPCB Part URL; ComponentLink2URL: https://jlcpcb.com/partdetail/C2204559; ComponentLink3Description: LCSC Part URL; ComponentLink3URL: https://lcsc.com/product-detail/Multilayer-Ceramic-Capacitors-MLCC---SMD-SMT_YAGEO-YAGEO-CQ0201ARNPO8BN2R0_C2204559.html
footprint CAP-0201 (0201 (0603M) Capacitor)
pins: 1, 2

## CQ0201ARNPO8BN2R4
designator C?  Capacitance: 2.4pF  (hidden comment: *)
Capacitor, Ceramic (MLCC), 2.4pF, 25V, NP0, SMD 0201; Manufacturer: YAGEO; Manufacturer Part Number: CQ0201ARNPO8BN2R4; Package Size: 0201; JLCPCB Basic Part: No; JLCPCB Part Number: C1855311; Supplier 1: LCSC; Category: Capacitors - MLCC; Supplier Part Number 1: C1855311; Voltage Rating: 25V; Temperature Coefficient: NP0; RoHS: Yes; ComponentLink1Description: Datasheet; ComponentLink1URL: https://wmsc.lcsc.com/wmsc/upload/file/pdf/v2/lcsc/2201271230_YAGEO-CQ0201ARNPO8BN2R4_C1855311.pdf; ComponentLink2Description: JLCPCB Part URL; ComponentLink2URL: https://jlcpcb.com/partdetail/C1855311; ComponentLink3Description: LCSC Part URL; ComponentLink3URL: https://lcsc.com/product-detail/Multilayer-Ceramic-Capacitors-MLCC---SMD-SMT_YAGEO-YAGEO-CQ0201ARNPO8BN2R4_C1855311.html
footprint CAP-0201 (0201 (0603M) Capacitor)
pins: 1, 2

## CQ0201ARNPO8BN4R7
designator C?  Capacitance: 4.7pF  (hidden comment: *)
Capacitor, Ceramic (MLCC), 4.7pF, 25V, NP0, SMD 0201; Manufacturer: YAGEO; Manufacturer Part Number: CQ0201ARNPO8BN4R7; Package Size: 0201; JLCPCB Basic Part: No; JLCPCB Part Number: C3847615; Supplier 1: LCSC; Category: Capacitors - MLCC; Supplier Part Number 1: C3847615; Voltage Rating: 25V; Temperature Coefficient: NP0; RoHS: Yes; ComponentLink1Description: Datasheet; ComponentLink1URL: https://wmsc.lcsc.com/wmsc/upload/file/pdf/v2/lcsc/2311211124_YAGEO-CQ0201ARNPO8BN4R7_C3847615.pdf; ComponentLink2Description: JLCPCB Part URL; ComponentLink2URL: https://jlcpcb.com/partdetail/C3847615; ComponentLink3Description: LCSC Part URL; ComponentLink3URL: https://lcsc.com/product-detail/Multilayer-Ceramic-Capacitors-MLCC---SMD-SMT_YAGEO-YAGEO-CQ0201ARNPO8BN4R7_C3847615.html
footprint CAP-0201 (0201 (0603M) Capacitor)
pins: 1, 2
